# Altium footprint library myPcbLib2.PcbLib: 56 footprints (part 2 of 4)
Each footprint in its own frame and in the unit in brackets; x right, y up, seen from the top. Pads: shape width x height; smd on the part's side, far side on the other; paste and mask are expansions set on the pad; w line width, h text height; cw(c..) or ccw(c..) is an arc to the next point about the centre after c.
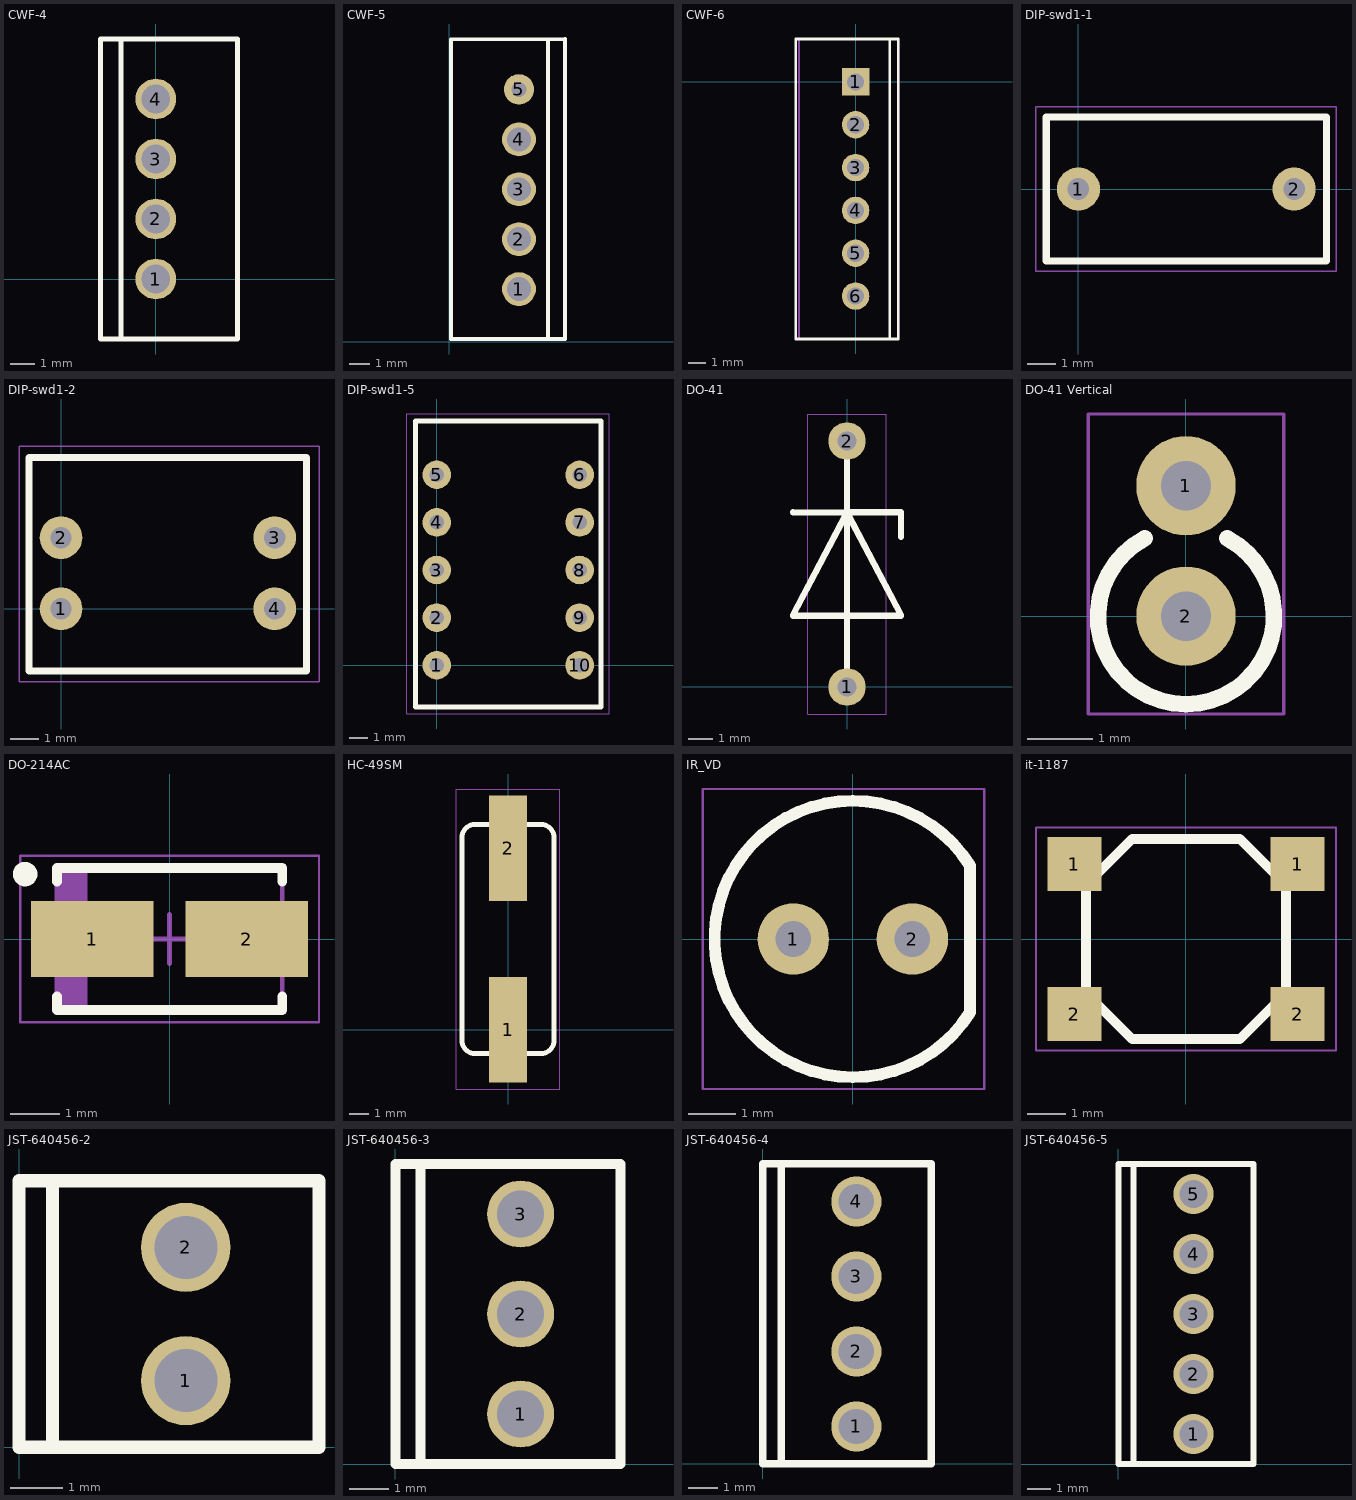
[diagram p1: the footprints below, top view; thin cyan lines are the x and y axes]

## CWF-4 [mm]
pads (4):
  round 1.7 hole 1.2: 1(0,0) 2(0,2.5) 3(0,5) 4(0,7.5)
Top Overlay:
  lines w0.2: -1.45,-2.5 -1.45,10 ; -2.3,-2.5 3.4,-2.5 3.4,10 -2.3,10 -2.3,-2.5
Top Mechanical 9/Mechanical 10:
  text ".Comment" at 1.056,9.623 h1.52
  text ".Designator" at 2.216,9.623 h1.52
3D body "CWF_4_V.STEP": height 7.7, standoff -1, extent -2.25,-2.55 3.45,9.95

## CWF-5 [mm]
pads (5):
  round 1.7 hole 1.2: 1(3.5,2.65) 2(3.5,5.15) 3(3.5,7.65) 4(3.5,10.15)
  round 1.524 hole 0.762: 5(3.5,12.65)
Top Overlay:
  lines w0.2: 4.95,0.15 4.95,14.55 4.95,15.15 ; 0.1,0.15 0.1,14.55 0.1,15.15 5.8,15.175 5.8,14.55 5.8,0.15 0.1,0.15
Top Mechanical 9/Mechanical 10:
  text ".Comment" at 2.444,9.577 h1.52
  text ".Designator" at 1.284,9.577 h1.52
3D body "User Library-DS1069-5 CWF-5.step": height 7, standoff -3.5, extent 0.05,0.15 5.8,15.15

## CWF-6 [mm]
height 6
pads (6):
  rect 1.6x1.6 hole 1: 1(0,0)
  round 1.6 hole 1: 2(0,-2.5) 3(0,-5) 4(0,-7.5) 5(0,-10) 6(0,-12.5)
Top Overlay:
  lines w0.15: 2,-15 2,2.5 ; -3.5,-15 -3.5,2.5 2.5,2.5 2.5,-15 -3.5,-15
Top Component Outline:
  lines w0.1: 2,-15 2,2.5 ; -3.3,-15 2.5,-15 2.5,2.5 -3.3,2.5 -3.3,-15
Top Designator:
  text ".Designator" at -1.456,-6.147 h0.8
Top Mechanical 7/Mechanical 8:
  text ".Comment" at -1.27,3.41 h0.6
3D body "User Library-CWF-6.STEP": height 7, standoff -3.5, extent -3.525,-15 2.225,2.5

## DIP-swd1-1 [mil] "SWD1-2"
pads (2):
  round 60 hole 30: 1(0,0) 2(300,0)
Top Overlay:
  lines w10: -44.88,-100 344.88,-100 344.88,100 -44.88,100 -44.88,-100
Top Mechanical 9/Mechanical 10:
  text ".Designator" at 50.26,8.49 h60
  text ".Comment" at 50.26,-37.17 h60
Mechanical 15:
  lines w1.97: -59.06,-114.17 358.27,-114.17 358.27,114.17 -59.06,114.17 -59.06,-114.17

## DIP-swd1-2 [mil] "SWD1-2"
pads (4):
  round 60 hole 30: 1(0,0) 2(0,100) 3(300,100) 4(300,0)
Top Overlay:
  lines w10: -44.88,-87.4 344.88,-87.4 344.88,212.6 -44.88,212.6 -44.88,-87.4
Top Mechanical 9/Mechanical 10:
  text ".Designator" at 50.26,59.67 h60
  text ".Comment" at 50.26,14.02 h60
Mechanical 15:
  lines w1.97: -59.06,-102.36 362.21,-102.36 362.21,228.35 -59.06,228.35 -59.06,-102.36

## DIP-swd1-5 [mil] "SWD1-5"
pads (10):
  round 60 hole 30: 1(0,0) 2(0,100) 3(0,200) 4(0,300) 5(0,400) 6(300,400) 7(300,300) 8(300,200) 9(300,100) 10(300,0)
Top Overlay:
  lines w10: -44.88,-87.4 344.88,-87.4 344.88,512.6 -44.88,512.6 -44.88,-87.4
Top Mechanical 9/Mechanical 10:
  text ".Designator" at 50.26,205.34 h60
  text ".Comment" at 50.26,159.69 h60
Mechanical 15:
  lines w1.97: -62.99,-102.36 362.21,-102.36 362.21,527.56 -62.99,527.56 -62.99,-102.36

## DO-41 [mil] "zener diode"
pads (2):
  round 60 hole 30: 1(0,0) 2(0,393.7)
Top Overlay:
  lines w10: -86.61,279.53 0,279.51 -86.61,114.17 0,114.17 86.61,114.17 0,279.53 86.61,279.53 86.61,240.16 ; 0,0 0,393.7
Top Mechanical 9/Mechanical 10:
  text ".Designator" at 34.51,323.45 h60
  text ".Comment" at 34.51,277.8 h60
Mechanical 15:
  lines w1.97: -62.99,-43.31 62.99,-43.31 62.99,437.01 -62.99,437.01 -62.99,-43.31
3D body "User Library-DO-41 10mm.step": height 171.73, standoff -39.37, extent -53.64,-16.93 53.64,410.63

## DO-41 Vertical [mil]
pads (2):
  round 60 hole 30: 1(0,78.74) 2(0,0)
Top Overlay:
  lines w10: -24.95,46.93 ccw(c0,0) 24.95,46.93
Mechanical 15:
  lines w1.97: -59.06,-59.06 59.06,-59.06 59.06,122.05 -59.06,122.05 -59.06,-59.06
3D body "User Library-DO_41_Vertical_H6P7.STEP": height 280.71, standoff -59.06, extent -53.15,-53.15 53.15,95.67

## DO-214AC [mm] "Molded Diode, 2-Leads, Body 4,30x2,70mm, IPC Medium Density"
height 2.44
pads (2):
  rect 2.5x1.55 smd: 1(-1.575,0) 2(1.575,0)
Top Overlay:
  circle w0.25: c-2.95,1.325 r0.125
  lines w0.2: -2.3,-1.175 -2.3,-1.45 2.3,-1.45 2.3,-1.175 ; -2.3,1.175 -2.3,1.45 2.3,1.45 2.3,1.175
Top Mechanical 9/Mechanical 10:
  text ".Comment" at -2.523,-0.844 h1.52
  text ".Designator" at -2.523,0.316 h1.52
Top Mechanical 13/Mechanical 14:
  rectangle: -2.3,-1.45 -1.681,1.45
  lines w0.1: -2.3,-1.45 -2.3,1.45 2.3,1.45 2.3,-1.45 -2.3,-1.45
Mechanical 15:
  lines w0.05: -3.05,-1.7 -3.05,1.7 3.05,1.7 3.05,-1.7 -3.05,-1.7
  lines w0.1: -0.5,0 0.5,0 ; 0,-0.5 0,0.5
3D body "User Library-DO-214AC SMA.step": height 2.4, standoff 0, extent -2.6,-1.3 2.6,1.3

## HC-49SM [mm] "кв резонатор"
pads (2):
  rect 2x5.5 smd: 1(0,0) 2(0,9.5)
Top Overlay:
  lines w0.254: -2.415,-0.55 ccw(c-1.715,-0.55) -1.715,-1.25 1.715,-1.25 ccw(c1.715,-0.55) 2.415,-0.55 2.415,10.05 ccw(c1.715,10.05) 1.715,10.75 -1.715,10.75 ccw(c-1.715,10.05) -2.415,10.05 -2.415,-0.55
Top Mechanical 9/Mechanical 10:
  text ".Comment" at -2.623,3.756 h1.52
  text ".Designator" at -2.623,4.916 h1.52
Mechanical 15:
  lines w0.05: -2.7,-3.1 2.7,-3.1 2.7,12.6 -2.7,12.6 -2.7,-3.1

## IR_VD [mil]
pads (2):
  round 60 hole 30: 1(-50,0) 2(50,0)
Top Overlay:
  lines w10: 98.49,-61.55 cw(c0,0) 98.49,61.55 98.49,-61.55
Top Mechanical 9/Mechanical 10:
  text ".Designator" at -100.33,60.66 h60
  text ".Comment" at -100.33,15 h60
Mechanical 15:
  lines w1.97: -125.98,-125.98 110.24,-125.98 110.24,125.98 -125.98,125.98 -125.98,-125.98
3D body "SW3DPS-5MM LED RED-DEFAULT.X_T": height 338.58, standoff -196.85, extent -100.26,-100.39 100.26,100.39

## it-1187 [mm] "switch"
pads (4):
  rect 1.4x1.4 smd: 1(-2.9,1.95) 1(2.9,1.95) 2(-2.9,-1.95) 2(2.9,-1.95)
Top Overlay:
  lines w0.254: -2.6,-1.4 -1.4,-2.6 1.4,-2.6 2.6,-1.4 2.6,1.4 1.4,2.6 -1.4,2.6 -2.6,1.4 -2.6,-1.4
Top Mechanical 9/Mechanical 10:
  text ".Designator" at -2.523,0.316 h1.52
  text ".Comment" at -2.523,-0.844 h1.52
Mechanical 15:
  lines w0.05: -3.9,-2.9 3.9,-2.9 3.9,2.9 -3.9,2.9 -3.9,-2.9
3D body "User Library-IT-1187.step": height 1.5, standoff 0, extent -3.2,-2.6 3.2,2.6

## JST-640456-2 [mm]
pads (2):
  round 1.7 hole 1.2: 1(3.18,1.27) 2(3.18,3.81)
Top Overlay:
  lines w0.254: 0.64,0 0.64,5.08 ; 1.6,0 1.7,0 ; 0,0 0,5.08 5.72,5.08 5.72,0 0,0
Top Mechanical 9/Mechanical 10:
  text ".Comment" at -0.256,0.177 h1.52
  text ".Designator" at -1.416,0.177 h1.52
3D body "User Library-640456-2.step": height 10.03, standoff -3.56, extent -0.061,0 5.781,5.08

## JST-640456-3 [mm]
pads (3):
  round 1.7 hole 1.2: 1(3.18,1.27) 2(3.18,3.81) 3(3.18,6.35)
Top Overlay:
  lines w0.254: 0.64,0 0.64,7.62 ; 1.6,0 1.7,0 ; 0,0 0,7.62 5.72,7.62 5.72,0 0,0
Top Mechanical 9/Mechanical 10:
  text ".Comment" at -0.356,0.377 h1.52
  text ".Designator" at -1.516,0.377 h1.52
3D body "User Library-640456-3.step": height 10.03, standoff -3.56, extent 0.005,0 5.847,7.62

## JST-640456-4 [mm]
pads (4):
  round 1.7 hole 1.2: 1(3.18,1.27) 2(3.18,3.81) 3(3.18,6.35) 4(3.18,8.89)
Top Overlay:
  lines w0.254: 0.64,0 0.64,10.16 ; 1.6,0 1.7,0 ; 0,0 5.72,0 5.72,10.16 0,10.16 0,0
Top Mechanical 9/Mechanical 10:
  text ".Comment" at -0.256,0.177 h1.52
  text ".Designator" at -1.416,0.177 h1.52
3D body "User Library-640456-4.step": height 10.03, standoff -3.56, extent -0.122,0 5.72,10.16

## JST-640456-5 [mm]
pads (5):
  round 1.7 hole 1.2: 1(3.18,1.27) 2(3.18,3.81) 3(3.18,6.35) 4(3.18,8.89) 5(3.18,11.43)
Top Overlay:
  lines w0.254: 0.64,0 0.64,12.7 ; 1.6,0 1.7,0 ; 0,0 0,12.7 5.72,12.7 5.72,0 0,0
Top Mechanical 9/Mechanical 10:
  text ".Comment" at -0.256,0.177 h1.52
  text ".Designator" at -1.416,0.177 h1.52
3D body "User Library-640456-5.step": height 10.03, standoff -3.56, extent 0,0 5.842,12.7